# Altium footprint library LimeMicroAltiumLib.PcbLib: 760 footprints (part 9 of 50)
Each footprint in its own frame and in the unit in brackets; x right, y up, seen from the top. Pads: shape width x height; smd on the part's side, far side on the other; paste and mask are expansions set on the pad; w line width, h text height; cw(c..) or ccw(c..) is an arc to the next point about the centre after c.
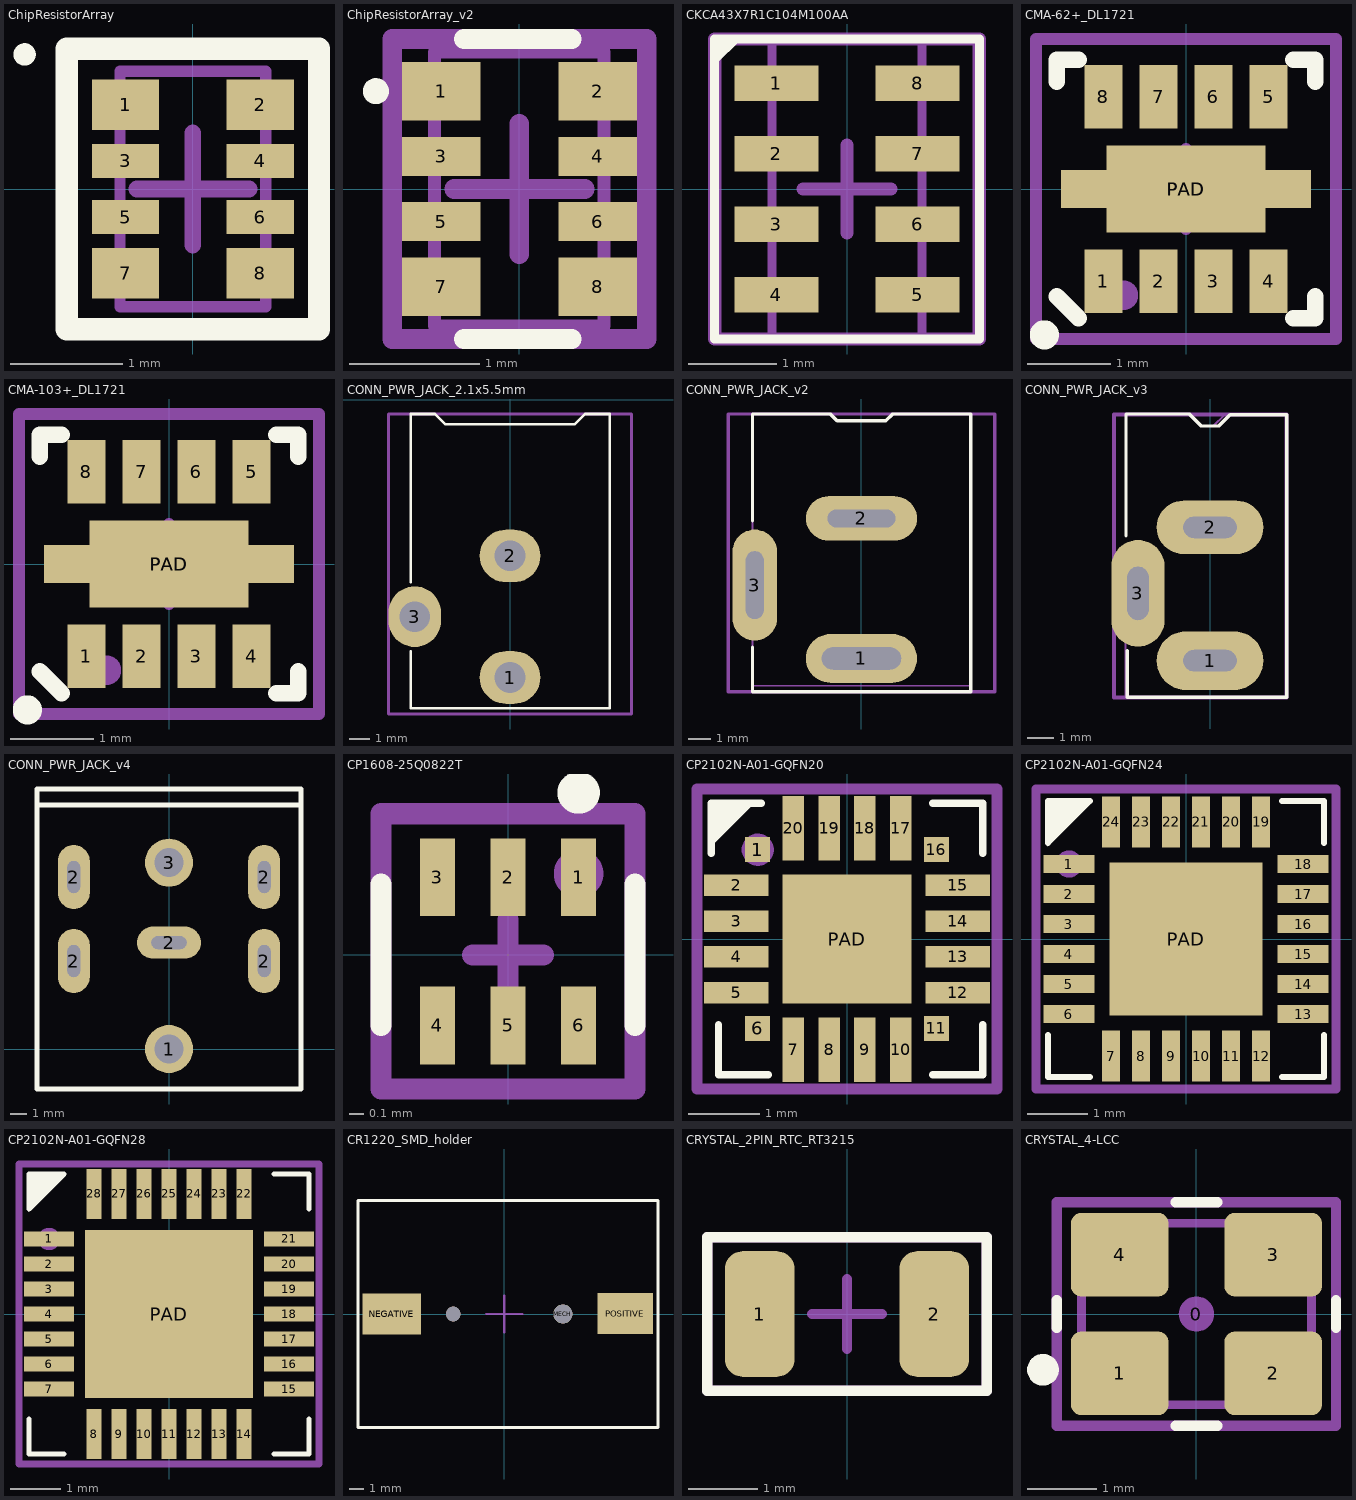
[diagram p8: the footprints below, top view; thin cyan lines are the x and y axes]

## ChipResistorArray [mm] "Chip Array, Flat, 8-Leads, Pitch 0,60mm,  Body 2,05x1,05mm,  IPC Medium Density"
height 0.5
pads (8):
  rect 0.6x0.45 smd mask+0.05: 1(-0.6,0.75) 2(0.6,0.75) 7(-0.6,-0.75) 8(0.6,-0.75)
  rect 0.6x0.3 smd mask+0.05: 3(-0.6,0.25) 4(0.6,0.25) 5(-0.6,-0.25) 6(0.6,-0.25)
Top Overlay:
  circle w0.1: c-1.5,1.2 r0.05
  lines w0.2: -1.125,-1.25 1.125,-1.25 1.125,1.25 -1.125,1.25 -1.125,-1.25
Top Solder:
  region: 0.25,-1.025 0.25,1.025 0.95,1.025 0.95,-1.025
  region: -0.95,-1.025 -0.95,1.025 -0.25,1.025 -0.25,-1.025
Mechanical 13:
  lines w0.1: -0.65,-1.05 0.65,-1.05 0.65,1.05 -0.65,1.05 -0.65,-1.05
Mechanical 15:
  lines w0.15: -0.5,0 0.5,0 ; 0,-0.5 0,0.5 ; -1.1,-1.25 1.1,-1.25 1.1,1.25 -1.1,1.25 -1.1,-1.25
  text ".Designator" at 0,0 h0.55
3D body "User Library-CAT10-103.STEP": height 0.4, standoff 0, extent -0.525,-1.025 0.475,0.975

## ChipResistorArray_v2 [mm] "Chip Array, Flat, 8-Leads, Pitch 0,60mm,  Body 2,05x1,05mm,  IPC Medium Density"
height 0.5
pads (8):
  rect 0.6x0.45 smd mask+0.01: 1(-0.6,0.75) 2(0.6,0.75) 7(-0.6,-0.75) 8(0.6,-0.75)
  rect 0.6x0.3 smd mask+0.01: 3(-0.6,0.25) 4(0.6,0.25) 5(-0.6,-0.25) 6(0.6,-0.25)
Top Overlay:
  circle w0.1: c-1.1,0.75 r0.05
  lines w0.15: -0.425,-1.15 0.4,-1.15 ; -0.425,1.15 0.4,1.15
Mechanical 13:
  lines w0.1: -0.65,-1.05 -0.65,1.05 0.65,1.05 0.65,-1.05 -0.65,-1.05
Mechanical 15:
  circle w0.1: c-0.6,0.75 r0.05
  lines w0.15: -0.5,0 0.5,0 ; 0,-0.5 0,0.5 ; -0.975,-1.15 -0.975,1.15 0.975,1.15 0.975,-1.15 -0.975,-1.15
  text ".Designator" at 0,0 h0.55
3D body "User Library-CAT10-103.STEP": height 0.4, standoff 0, extent -0.525,-1.025 0.475,0.975

## CKCA43X7R1C104M100AA [mm]
height 1
pads (8):
  rect 0.95x0.4 smd: 1(-0.8,1.2) 2(-0.8,0.4) 3(-0.8,-0.4) 4(-0.8,-1.2) 5(0.8,-1.2) 6(0.8,-0.4) 7(0.8,0.4) 8(0.8,1.2)
Top Overlay:
  region: -1.5,1.4 -1.2,1.7 -1.5,1.7
  lines w0.1: -1.5,-1.7 1.5,-1.7 1.5,1.7 -1.5,1.7 -1.5,-1.7
Mechanical 13:
  lines w0.1: -0.85,-1.7 -0.85,1.7 0.85,1.7 0.85,-1.7 -0.85,-1.7
Mechanical 15:
  circle w0.15: c-0.9,1.2 r0.05
  lines w0.15: -0.5,0 0.5,0 ; 0,-0.5 0,0.5 ; -1.5,-1.7 -1.5,1.7 1.5,1.7 1.5,-1.7 -1.5,-1.7
  text ".Designator" at 0,0 h0.55
3D body "User Library-TC164.step": height 0.55, standoff 0, extent -0.8,-1.6 0.8,1.6

## CMA-62+_DL1721 [mm] "Quad Flat No Lead, Plastic; 16 Terminals; Body 3 x 3 mm; Pitch 0.5 mm"
height 0.8
pads (10):
  rect 0.46x0.76 smd mask+0.05: 1(-0.99,-1.105) 2(-0.33,-1.105) 3(0.33,-1.105) 4(0.99,-1.105) 5(0.99,1.105) 6(0.33,1.105) 7(-0.33,1.105) 8(-0.99,1.105)
  rect 3x0.46 smd mask+0.05: PAD(0,0)
  rect 1.91x1.04 smd mask+0.05: PAD(0,0)
Top Overlay:
  circle w0.25: c-1.7,-1.75 r0.05
  lines w0.2: -1.55,-1.29 -1.29,-1.55 ; -1.55,1.29 -1.55,1.55 -1.29,1.55 ; 1.29,-1.55 1.55,-1.55 1.55,-1.29 ; 1.29,1.55 1.55,1.55 1.55,1.29
Mechanical 15:
  circle w0.3: c-0.75,-1.275 r0.025
  lines w0.15: -0.475,0 0,0 ; 0,-0.475 0,0 ; 0,0.475 0,0 ; 0.475,0 0,0 ; -1.8,-1.8 -1.8,1.8 1.8,1.8 1.8,-1.8 -1.8,-1.8
  text ".Designator" at 0,0 h0.55
3D body "User Library-DFN-8.STEP": height 0.8, standoff 0, extent -1.5,-1.51 1.5,1.51

## CMA-103+_DL1721 [mm] "Quad Flat No Lead, Plastic; 16 Terminals; Body 3 x 3 mm; Pitch 0.5 mm"
height 0.8
pads (10):
  rect 0.46x0.76 smd mask+0.05: 1(-0.99,-1.105) 2(-0.33,-1.105) 3(0.33,-1.105) 4(0.99,-1.105) 5(0.99,1.105) 6(0.33,1.105) 7(-0.33,1.105) 8(-0.99,1.105)
  rect 3x0.46 smd mask+0.05: PAD(0,0)
  rect 1.91x1.04 smd mask+0.05: PAD(0,0)
Top Overlay:
  circle w0.25: c-1.7,-1.75 r0.05
  lines w0.2: -1.55,-1.29 -1.29,-1.55 ; -1.55,1.29 -1.55,1.55 -1.29,1.55 ; 1.29,-1.55 1.55,-1.55 1.55,-1.29 ; 1.29,1.55 1.55,1.55 1.55,1.29
Mechanical 15:
  circle w0.3: c-0.75,-1.275 r0.025
  lines w0.15: -0.475,0 0,0 ; 0,-0.475 0,0 ; 0,0.475 0,0 ; 0.475,0 0,0 ; -1.8,-1.8 -1.8,1.8 1.8,1.8 1.8,-1.8 -1.8,-1.8
  text ".Designator" at 0,0 h0.55
3D body "User Library-DFN-8.STEP": height 0.8, standoff 0, extent -1.5,-1.51 1.5,1.51

## CONN_PWR_JACK_2.1x5.5mm [mm] "Power Connector, 2.1mm ID, 5.5mm OD"
height 11
pads (3):
  oval 3x2.6 hole 1.511: 1(0,-13.7) 2(0,-7.7)
  oval 2.6x3 hole 1.511: 3(-4.7,-10.7)
Top Overlay:
  lines w0.127: -4.9,-12.4 -4.9,-15.225 4.925,-15.225 4.925,-0.7 3.7,-0.7 3.2,-1.2 -3.2,-1.2 -3.7,-0.7 -4.9,-0.7 -4.9,-9
Mechanical 13:
  lines w0.076: -4.9,-12.4 -4.9,-15.225 4.925,-15.225 4.925,-0.7 3.7,-0.7 3.2,-1.2 -3.2,-1.2 -3.7,-0.7 -4.9,-0.7 -4.9,-9
Mechanical 15:
  lines w0.15: -6,-15.5 6,-15.5 6,-0.7 -6,-0.7 -6,-15.5
  text ".Designator" at 0,-7.7 h0.55
3D body "3100-522 Connector.stp": height 11, standoff -3.5, extent -4.9,-14.1 4.5,0

## CONN_PWR_JACK_v2 [mm] "Power Connector, 2.1mm ID, 5.5mm OD"
height 11
pads (3):
  oval 5x2.2 hole 1 slot 3.56 at 0 deg: 1(0,-14)
  oval 5x2 hole 0.8 slot 3.05 at 0 deg: 2(0,-7.7)
  oval 2x5 hole 0.8 slot 3.05 at 90 deg: 3(-4.8,-10.7)
Top Overlay:
  lines w0.15: -4.9,-13.5 -4.9,-15.5 4.925,-15.5 4.925,-3 1.4,-3 1.1,-3.3 -1.1,-3.3 -1.4,-3 -4.9,-3 -4.9,-7.8
Mechanical 13:
  lines w0.076: -4.9,-12.4 -4.9,-15.225 4.925,-15.225 4.925,-3 1.4,-3 1.1,-3.3 -1.1,-3.3 -1.4,-3 -4.9,-3 -4.9,-9
Mechanical 15:
  lines w0.15: -6,-15.5 -6,-3 6,-3 6,-15.5 -6,-15.5
  text ".Designator" at -0.1,-9 h0.55
3D body "3100-522 Connector.stp": height 11, standoff -3.5, extent -4.9,-14.1 4.5,0

## CONN_PWR_JACK_v3 [mm]
height 7.4
pads (3):
  oval 4x2.2 hole 0.8 slot 2 at 0 deg: 1(0,-13.675)
  oval 4x2 hole 0.8 slot 2 at 0 deg: 2(0,-8.675)
  oval 2x4 hole 0.8 slot 2 at 90 deg: 3(-2.7,-11.15)
Top Overlay:
  lines w0.127: -3.15,-9 -3.15,-4.425 -0.775,-4.425 -0.325,-4.875 0.325,-4.875 0.75,-4.45 2.875,-4.45 2.875,-15.05 -3.1,-15.05 -3.1,-13.3
Mechanical 13:
  lines w0.076: -3.175,-12.4 -3.175,-15.05 2.9,-15.05 2.9,-4.45 0.55,-4.45 0.125,-4.875 -0.325,-4.875 -0.775,-4.425 -3.15,-4.425 -3.15,-9
Mechanical 15:
  lines w0.15: -3.6,-15.05 -3.6,-4.45 2.875,-4.45 2.875,-15.05 -3.6,-15.05
  text ".Designator" at -0.1,-9 h0.55
3D body "pj-031dh.stp": height 7.4, standoff -3.2, extent -2.85,-14.025 2.55,-2.425

## CONN_PWR_JACK_v4 [mm]
pads (7):
  round 3 hole 1.8: 1(0,0) 3(0,11.65)
  oval 2x4 hole 0.8 slot 2 at 90 deg: 2(-5.95,5.5) 2(-5.95,10.75) 2(5.95,5.5) 2(5.95,10.75)
  oval 4x2 hole 0.8 slot 2.2 at 0 deg: 2(0,6.65)
Top Overlay:
  lines w0.3: -8.25,15.25 8.25,15.25 ; -8.25,-2.5 -8.25,16.25 8.25,16.25 8.25,-2.5 -8.25,-2.5
Mechanical 15:
  lines w0.15: -8.25,-2.5 -8.25,16.25 8.25,16.25 8.25,-2.5 -8.25,-2.5
  text ".designator" at 0,6.6 h0.55

## CP1608-25Q0822T [mm]
pads (6):
  rect 0.25x0.55 smd mask+0.05: 1(0.5,0.55) 2(0,0.55) 3(-0.5,0.55) 4(-0.5,-0.5) 5(0,-0.5) 6(0.5,-0.5)
Top Overlay:
  circle w0.25: c0.5,1.15 r0.025
  lines w0.15: -0.9,-0.5 -0.9,0.5 ; 0.9,-0.5 0.9,0.5
Mechanical 15:
  circle w0.3: c0.5,0.575 r0.025
  lines w0.15: -0.25,0 0.25,0 ; 0,-0.25 0,0.25 ; -0.9,-0.95 -0.9,1 0.9,1 0.9,-0.95 -0.9,-0.95
  text ".Designator" at 0,0 h0.55
3D body: height 0.6, standoff 0, extent -0.8,-0.4 0.8,0.4
3D body: height 0.6, standoff 0, extent 0.463,-0.075 0.663,0.15
3D body: height 0.6, standoff 0, extent -0.65,-0.425 -0.35,-0.275
3D body: height 0.6, standoff 0, extent -0.15,-0.425 0.15,-0.275
3D body: height 0.6, standoff 0, extent 0.35,-0.425 0.65,-0.275
3D body: height 0.6, standoff 0, extent 0.35,0.275 0.65,0.425
3D body: height 0.6, standoff 0, extent -0.15,0.275 0.15,0.425
3D body: height 0.6, standoff 0, extent -0.65,0.275 -0.35,0.425

## CP2102N-A01-GQFN20 [mm]
pads (21):
  rect 0.35x0.35 smd mask+0.05: 1(-1.25,1.25) 6(-1.25,-1.25) 11(1.25,-1.25) 16(1.25,1.25)
  rect 0.9x0.3 smd mask+0.05: 2(-1.55,0.75) 3(-1.55,0.25) 4(-1.55,-0.25) 5(-1.55,-0.75) 12(1.55,-0.75) 13(1.55,-0.25) 14(1.55,0.25) 15(1.55,0.75)
  rect 0.3x0.9 smd mask+0.05: 7(-0.75,-1.55) 8(-0.25,-1.55) 9(0.25,-1.55) 10(0.75,-1.55) 17(0.75,1.55) 18(0.25,1.55) 19(-0.25,1.55) 20(-0.75,1.55)
  rect 1.8x1.8 smd mask+0.05: PAD(0,0)
Top Overlay:
  region: -1.9,1.3 -1.3,1.9 -1.9,1.9
  lines w0.1: -1.9,1.2 -1.9,1.9 -1.2,1.9 ; -1.8,-1.2 -1.8,-1.9 -1.1,-1.9 ; 1.2,-1.9 1.9,-1.9 1.9,-1.2 ; 1.2,1.9 1.9,1.9 1.9,1.2
Mechanical 15:
  circle w0.25: c-1.25,1.25 r0.1
  lines w0.15: -0.5,0 0.5,0 ; 0,-0.5 0,0.5 ; -2.1,-2.1 2.1,-2.1 2.1,2.1 -2.1,2.1 -2.1,-2.1
  text ".Designator" at 0,0 h0.55
3D body "SW3dPS-QFN-20.STEP": height 0.62, standoff -0.08, extent -1.5,-1.5 1.5,1.5

## CP2102N-A01-GQFN24 [mm]
pads (25):
  rect 0.85x0.3 smd mask+0.05: 1(-1.95,1.25) 2(-1.95,0.75) 3(-1.95,0.25) 4(-1.95,-0.25) 5(-1.95,-0.75) 6(-1.95,-1.25) 13(1.95,-1.25) 14(1.95,-0.75) 15(1.95,-0.25) 16(1.95,0.25) 17(1.95,0.75) 18(1.95,1.25)
  rect 0.3x0.85 smd mask+0.05: 7(-1.25,-1.95) 8(-0.75,-1.95) 9(-0.25,-1.95) 10(0.25,-1.95) 11(0.75,-1.95) 12(1.25,-1.95) 19(1.25,1.95) 20(0.75,1.95) 21(0.25,1.95) 22(-0.25,1.95) 23(-0.75,1.95) 24(-1.25,1.95)
  rect 2.55x2.55 smd mask+0.05: PAD(0,0)
Top Overlay:
  region: -2.3,1.55 -1.55,2.3 -2.3,2.3
  lines w0.1: -2.3,-1.6 -2.3,-2.3 -1.6,-2.3 ; 1.6,-2.3 2.3,-2.3 2.3,-1.6 ; 1.6,2.3 2.3,2.3 2.3,1.6 ; -2.3,1.6 -1.6,2.3 -2.3,2.3 -2.3,1.6
Mechanical 15:
  circle w0.25: c-1.95,1.25 r0.1
  lines w0.15: -0.5,0 0.5,0 ; 0,-0.5 0,0.5 ; -2.5,-2.5 -2.5,2.5 2.5,2.5 2.5,-2.5 -2.5,-2.5
  text ".Designator" at 0,0 h0.55
3D body "User Library-QFN 24 4x4.step": height 0.9, standoff 0, extent -2.002,-2.002 2.002,2.002

## CP2102N-A01-GQFN28 [mm]
pads (29):
  rect 1x0.3 smd mask+0.05: 1(-2.4,1.5) 2(-2.4,1) 3(-2.4,0.5) 4(-2.4,0) 5(-2.4,-0.5) 6(-2.4,-1) 7(-2.4,-1.5) 15(2.4,-1.5) 16(2.4,-1) 17(2.4,-0.5) 18(2.4,0) 19(2.4,0.5) 20(2.4,1) 21(2.4,1.5)
  rect 0.3x1 smd mask+0.05: 8(-1.5,-2.4) 9(-1,-2.4) 10(-0.5,-2.4) 11(0,-2.4) 12(0.5,-2.4) 13(1,-2.4) 14(1.5,-2.4) 22(1.5,2.4) 23(1,2.4) 24(0.5,2.4) 25(0,2.4) 26(-0.5,2.4) 27(-1,2.4) 28(-1.5,2.4)
  rect 3.35x3.35 smd mask+0.05: PAD(0,0)
Top Overlay:
  region: -2.8,2.05 -2.05,2.8 -2.8,2.8
  lines w0.1: -2.8,-2.1 -2.8,-2.8 -2.1,-2.8 ; 2.1,-2.8 2.8,-2.8 2.8,-2.1 ; 2.1,2.8 2.8,2.8 2.8,2.1 ; -2.8,2.1 -2.1,2.8 -2.8,2.8 -2.8,2.1
Mechanical 15:
  circle w0.25: c-2.4,1.5 r0.1
  lines w0.15: -0.5,0 0.5,0 ; 0,-0.5 0,0.5 ; -3,-3 -3,3 3,3 3,-3 -3,-3
  text ".Designator" at 0,0 h0.55
3D body "User Library-QFN28-0_5.STEP": height 1, standoff 0, extent -2.5,-2.5 2.5,2.5

## CR1220_SMD_holder [mm]
pads (4):
  round 1 hole 1 unplated mask+0.05: MECH(-3.5,0)
  round 1.3 hole 1.3 unplated mask+0.05: MECH(4,0)
  rect 4x2.8 smd mask+0.05: NEGATIVE(-7.7,0)
  rect 3.8x2.8 smd mask+0.05: POSITIVE(8.275,0.025)
Top Overlay:
  lines w0.2: -10,-7.75 10.5,-7.75 10.5,7.75 -10,7.75 -10,-7.75
Mechanical 15:
  lines w0.15: -1.25,0 1.25,0 ; 0,-1.25 0,1.25 ; -10,-7.75 10.5,-7.75 10.5,7.75 -10,7.75 -10,-7.75
  text ".Designator" at 0,0 h0.55
  text "NEGATIVE / TERMINAL" at -9.5,-1 h0.55
  text "POSITIVE / TERMINAL" at 6,-1 h0.55
3D body "User Library-cr1220.STEP": height 3.94, standoff -1, extent -8.75,-7.497 9.75,7.5

## CRYSTAL_2PIN_RTC_RT3215 [mm]
pads (2):
  rrect50% 1x1.8 smd mask+0.05: 1(-1.25,0) 2(1.25,0)
Top Overlay:
  lines w0.15: -2,-1.1 2,-1.1 2,1.1 -2,1.1 -2,-1.1
Mechanical 15:
  circle w0.2: c-1.3,0 r0.1
  lines w0.15: -0.5,0 0,0 ; 0,-0.5 0,0 ; 0,0.5 0,0 ; 0.5,0 0,0 ; -2,-1.1 2,-1.1 2,1.1 -2,1.1 -2,-1.1
  text ".Designator" at 0,0 h0.55
3D body "User Library-ABS07.STEP": height 0.91, standoff 0, extent -1.61,-0.76 1.61,0.76

## CRYSTAL_4-LCC [mm] "SMD Crystal 4-lead leadless package"
height 0.8
pads (5):
  round 0.508 on Mech15: 0(0,0)
  rrect25% 1.4x1.2 smd: 1(-1.1,-0.85) 2(1.1,-0.85) 3(1.1,0.85) 4(-1.1,0.85)
Top Overlay:
  circle w0.254: c-2.2,-0.8 r0.1
  lines w0.15: -2,-0.2 -2,0.2 ; -0.3,-1.6 0.3,-1.6 ; -0.3,1.6 0.3,1.6 ; 2,-0.2 2,0.2
Mechanical 13:
  lines w0.127: -1.65,-1.143 -1.493,-1.3 1.493,-1.3 1.65,-1.143 1.65,1.144 1.494,1.3 -1.493,1.3 -1.65,1.143 -1.65,-1.143
Mechanical 15:
  circle w0.35: c-1.4,-1.1 r0.141
  lines w0.15: -2,-1.6 2,-1.6 2,1.6 -2,1.6 -2,-1.6
  text ".Designator" at 0,0 h0.55
3D body "Crystal TXC Corp 7M series.STEP": height 0.8, standoff 0, extent -1.65,-1.3 1.65,1.3